# Altium footprint library My_PCB_6_28.PcbLib: 151 footprints (part 7 of 10)
Each footprint in its own frame and in the unit in brackets; x right, y up, seen from the top. Pads: shape width x height; smd on the part's side, far side on the other; paste and mask are expansions set on the pad; w line width, h text height; cw(c..) or ccw(c..) is an arc to the next point about the centre after c.
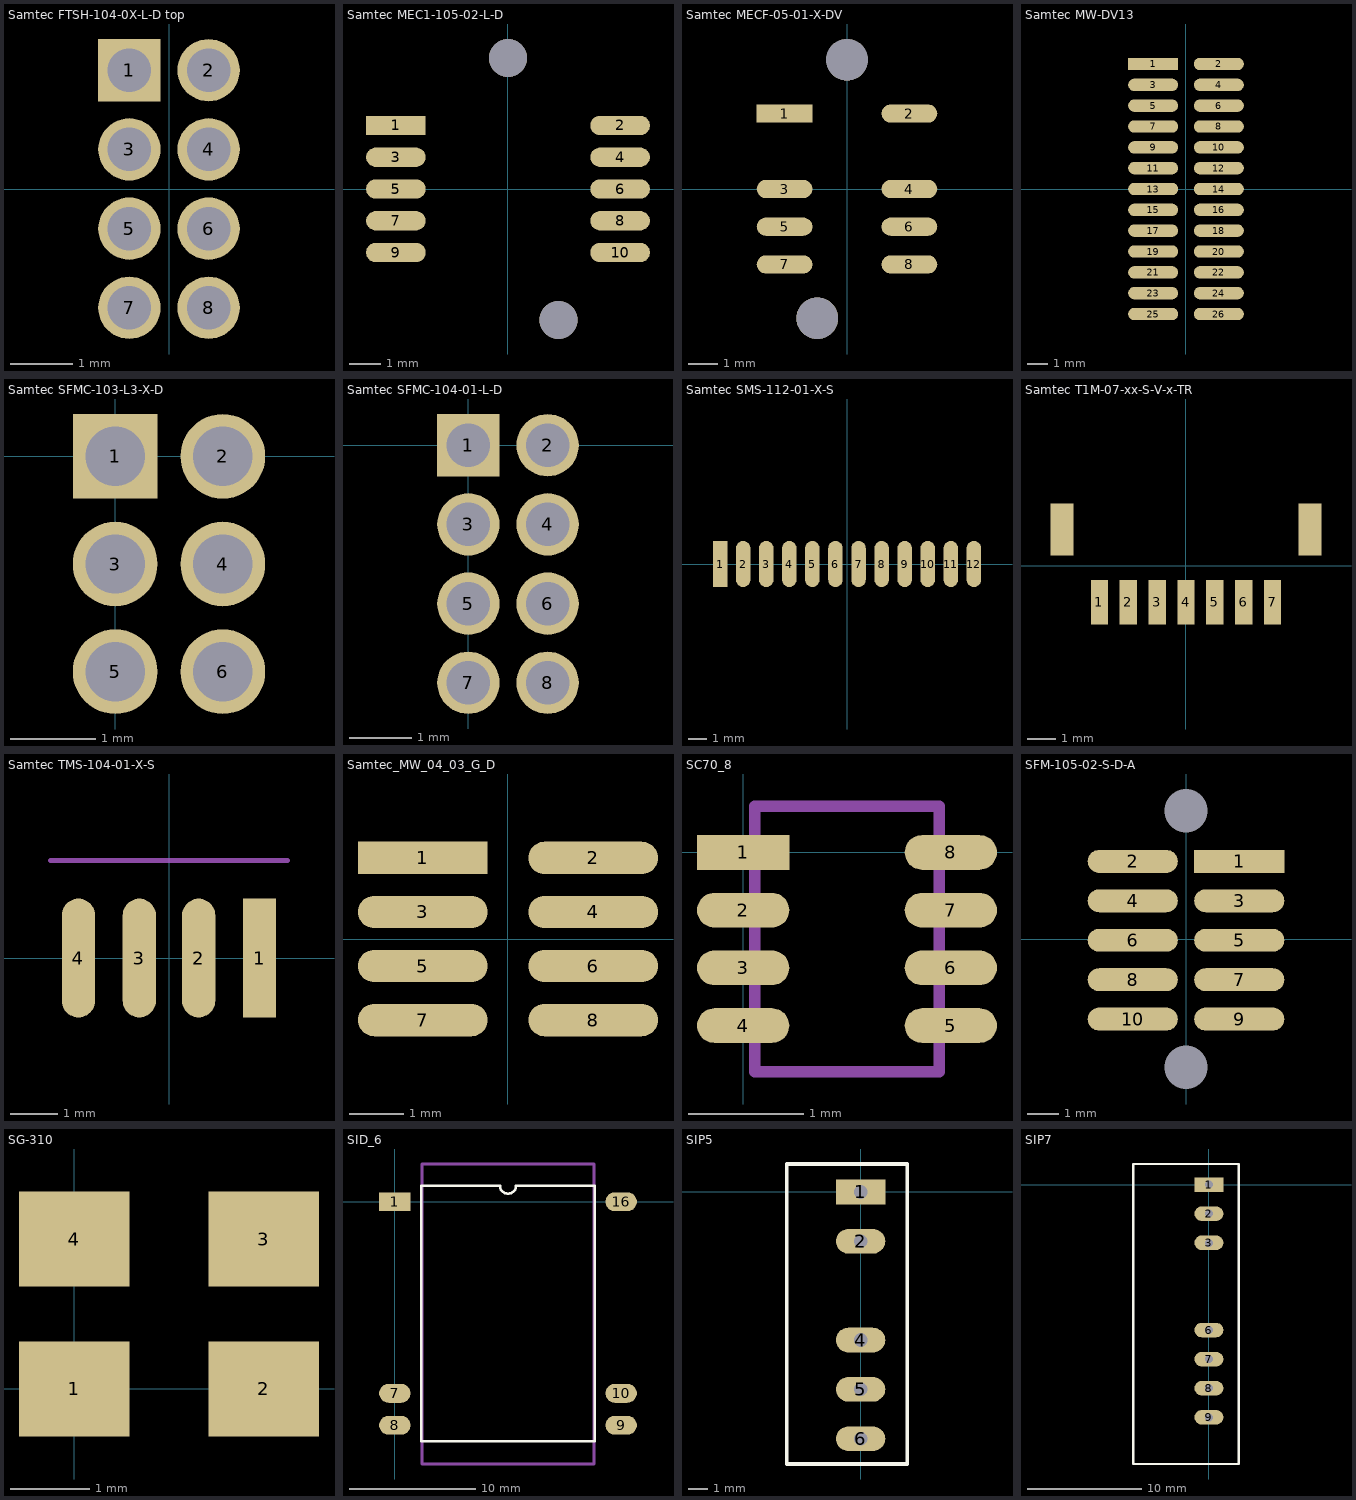
[diagram p6: the footprints below, top view; thin cyan lines are the x and y axes]

## Samtec FTSH-104-0X-L-D top [mm]
pads (8):
  rect 1x1 hole 0.7: 1(-0.635,1.905)
  round 1 hole 0.7: 2(0.635,1.905) 3(-0.635,0.635) 4(0.635,0.635) 5(-0.635,-0.635) 6(0.635,-0.635) 7(-0.635,-1.905) 8(0.635,-1.905)
3D body: height 5.57, standoff -2.28, extent -1.714,-2.54 1.715,2.54

## Samtec MEC1-105-02-L-D [mm]
pads (12):
  rect 1.88x0.61 smd: 1(-3.53,2)
  oval 1.88x0.61 smd: 2(3.531,2) 3(-3.53,1) 4(3.531,1) 5(-3.53,0) 6(3.531,0) 7(-3.53,-1) 8(3.531,-1) 9(-3.53,-2) 10(3.531,-2)
  round 1.2 hole 1.2: ""(0,4.122) ""(1.588,-4.122)
3D body: height 9.09, standoff -1.35, extent -4.242,-4.756 4.242,4.784

## Samtec MECF-05-01-X-DV [mm]
pads (10):
  rect 1.88x0.61 smd: 1(-2.1,2.54)
  oval 1.88x0.61 smd: 2(2.1,2.54) 3(-2.1,0) 4(2.1,0) 5(-2.1,-1.27) 6(2.1,-1.27) 7(-2.1,-2.54) 8(2.1,-2.54)
  round 1.4 hole 1.4: ""(-1,-4.35) ""(0,4.35)
3D body: height 8.75, standoff -1.3, extent -2.801,-5.232 2.801,5.232

## Samtec MW-DV13 [mm]
pads (26):
  rect 2.4x0.6 smd: 1(-1.575,6)
  oval 2.4x0.6 smd: 2(1.575,6) 3(-1.575,5) 4(1.575,5) 5(-1.575,4) 6(1.575,4) 7(-1.575,3) 8(1.575,3) 9(-1.575,2) 10(1.575,2) 11(-1.575,1) 12(1.575,1) 13(-1.575,0) 14(1.575,0) 15(-1.575,-1) 16(1.575,-1) 17(-1.575,-2) 18(1.575,-2) 19(-1.575,-3) 20(1.575,-3) 21(-1.575,-4) 22(1.575,-4) 23(-1.575,-5) 24(1.575,-5) 25(-1.575,-6) 26(1.575,-6)

## Samtec SFMC-103-L3-X-D [mm]
pads (6):
  rect 1x1 hole 0.7: 1(0,0)
  round 1 hole 0.7: 2(1.27,0) 3(0,-1.27) 4(1.27,-1.27) 5(0,-2.54) 6(1.27,-2.54)
3D body: height 4.57, standoff -1.91, extent -0.874,-3.35 2.174,0.841

## Samtec SFMC-104-01-L-D [mm]
pads (8):
  rect 1x1 hole 0.7: 1(0,0)
  round 1 hole 0.7: 2(1.27,0) 3(0,-1.27) 4(1.27,-1.27) 5(0,-2.54) 6(1.27,-2.54) 7(0,-3.81) 8(1.27,-3.81)
3D body: height 4.94, standoff -2.68, extent -0.924,-4.661 2.124,0.8

## Samtec SMS-112-01-X-S [mm]
pads (12):
  rect 0.8x2.54 smd: 1(-6.985,0)
  oval 0.8x2.54 smd: 2(-5.715,0) 3(-4.445,0) 4(-3.175,0) 5(-1.905,0) 6(-0.635,0) 7(0.635,0) 8(1.905,0) 9(3.175,0) 10(4.445,0) 11(5.715,0) 12(6.985,0)
3D body: height 1.67, standoff -1.37, extent -7.719,-0.994 7.749,10.055

## Samtec T1M-07-xx-S-V-x-TR [mm]
pads (9):
  rect 0.6x1.55 smd: 1(-3,-1.262) 2(-2,-1.262) 3(-1,-1.262) 4(0,-1.262) 5(1,-1.262) 6(2,-1.262) 7(3,-1.262)
  rect 0.8x1.8 smd: ""(-4.3,1.262) ""(4.3,1.262)
3D body: height 4.3, standoff 0, extent -4.5,-1.9 4.5,1.95

## Samtec TMS-104-01-X-S [mm]
pads (4):
  rect 0.7x2.5 smd: 1(1.905,0)
  oval 0.7x2.5 smd: 2(0.625,0) 3(-0.625,0) 4(-1.905,0)
Mechanical 3:
  lines w0.1: -2.5,2.05 2.5,2.05
3D body: height 1.47, standoff -0.97, extent -2.54,-1.118 2.54,10.312

## Samtec_MW_04_03_G_D [mm]
pads (8):
  rect 2.4x0.6 smd: 1(-1.575,1.5)
  oval 2.4x0.6 smd: 2(1.575,1.5) 3(-1.575,0.5) 4(1.575,0.5) 5(-1.575,-0.5) 6(1.575,-0.5) 7(-1.575,-1.5) 8(1.575,-1.5)
3D body: height 4.33, standoff 0.01, extent -2.603,-2 2.603,2

## SC70_8 [mm]
pads (8):
  rect 0.8x0.3 smd: 1(0,0)
  oval 0.8x0.3 smd: 2(0,-0.5) 3(0,-1) 4(0,-1.5) 5(1.8,-1.5) 6(1.8,-1) 7(1.8,-0.5) 8(1.8,0)
Mechanical 3:
  lines w0.1: 0.1,-1.9 0.1,0.4 1.7,0.4 1.7,-1.9 0.1,-1.9
3D body: height 0.95, standoff 0.07, extent 0.1,-1.9 1.7,0.4
3D body: height 0.95, standoff 0.07, extent 0.1,-1.9 1.7,0.4

## SFM-105-02-S-D-A [mm]
pads (12):
  rect 2.9x0.74 smd: 1(1.715,2.5)
  oval 2.9x0.74 smd: 2(-1.715,2.5) 3(1.715,1.23) 4(-1.715,1.23) 5(1.715,-0.04) 6(-1.715,-0.04) 7(1.715,-1.31) 8(-1.715,-1.31) 9(1.715,-2.58) 10(-1.715,-2.58)
  round 1.3 hole 1.4: ""(0,-4.13) ""(0,4.13)

## SG-310 [mm]
pads (4):
  rect 1.4x1.2 smd: 1(0,0) 2(2.4,0) 3(2.4,1.9) 4(0,1.9)
Top Overlay:
  text "." at -1.2,-1.1 h1

## SID_6 [mm]
pads (6):
  rect 2.5x1.5 smd: 1(0,0)
  oval 2.5x1.5 smd: 7(0,-15.24) 8(0,-17.78) 9(18,-17.78) 10(18,-15.24) 16(18,0)
Top Overlay:
  lines w0.2: 2.085,-19.05 2.085,1.27 8.365,1.27 ccw(c9,1.27) 9.635,1.27 15.915,1.27 15.915,-19.05 2.085,-19.05
Mechanical 1:
  lines w0.254: 2.15,-20.86 15.85,-20.86 15.85,3 2.15,3 2.15,-20.86
3D body: height 8, standoff 0.1, extent 2.15,-20.86 15.85,3

## SIP5 [mm]
pads (5):
  rect 2.54x1.27 hole 0.7: 1(0,0)
  oval 2.54x1.27 hole 0.7: 2(0,-2.54) 4(0,-7.62) 5(0,-10.16) 6(0,-12.7)
Top Overlay:
  lines w0.2: -3.8,-14 2.4,-14 2.4,1.44 -3.8,1.44 -3.8,-14

## SIP7 [mm]
pads (7):
  rect 2.54x1.27 hole 0.7: 1(0,0)
  oval 2.54x1.27 hole 0.7: 2(0,-2.54) 3(0,-5.08) 6(0,-12.7) 7(0,-15.24) 8(0,-17.78) 9(0,-20.32)
Top Overlay:
  lines w0.2: -6.6,-24.4 -6.6,1.8 2.6,1.8 2.6,-24.4 -6.6,-24.4
3D body: height 12.5, standoff -3.15, extent -6.385,-23.915 2.865,2.035